# Altium footprint library PCB_Footprints.PcbLib: 303 footprints (part 12 of 19)
Each footprint in its own frame and in the unit in brackets; x right, y up, seen from the top. Pads: shape width x height; smd on the part's side, far side on the other; paste and mask are expansions set on the pad; w line width, h text height; cw(c..) or ccw(c..) is an arc to the next point about the centre after c.
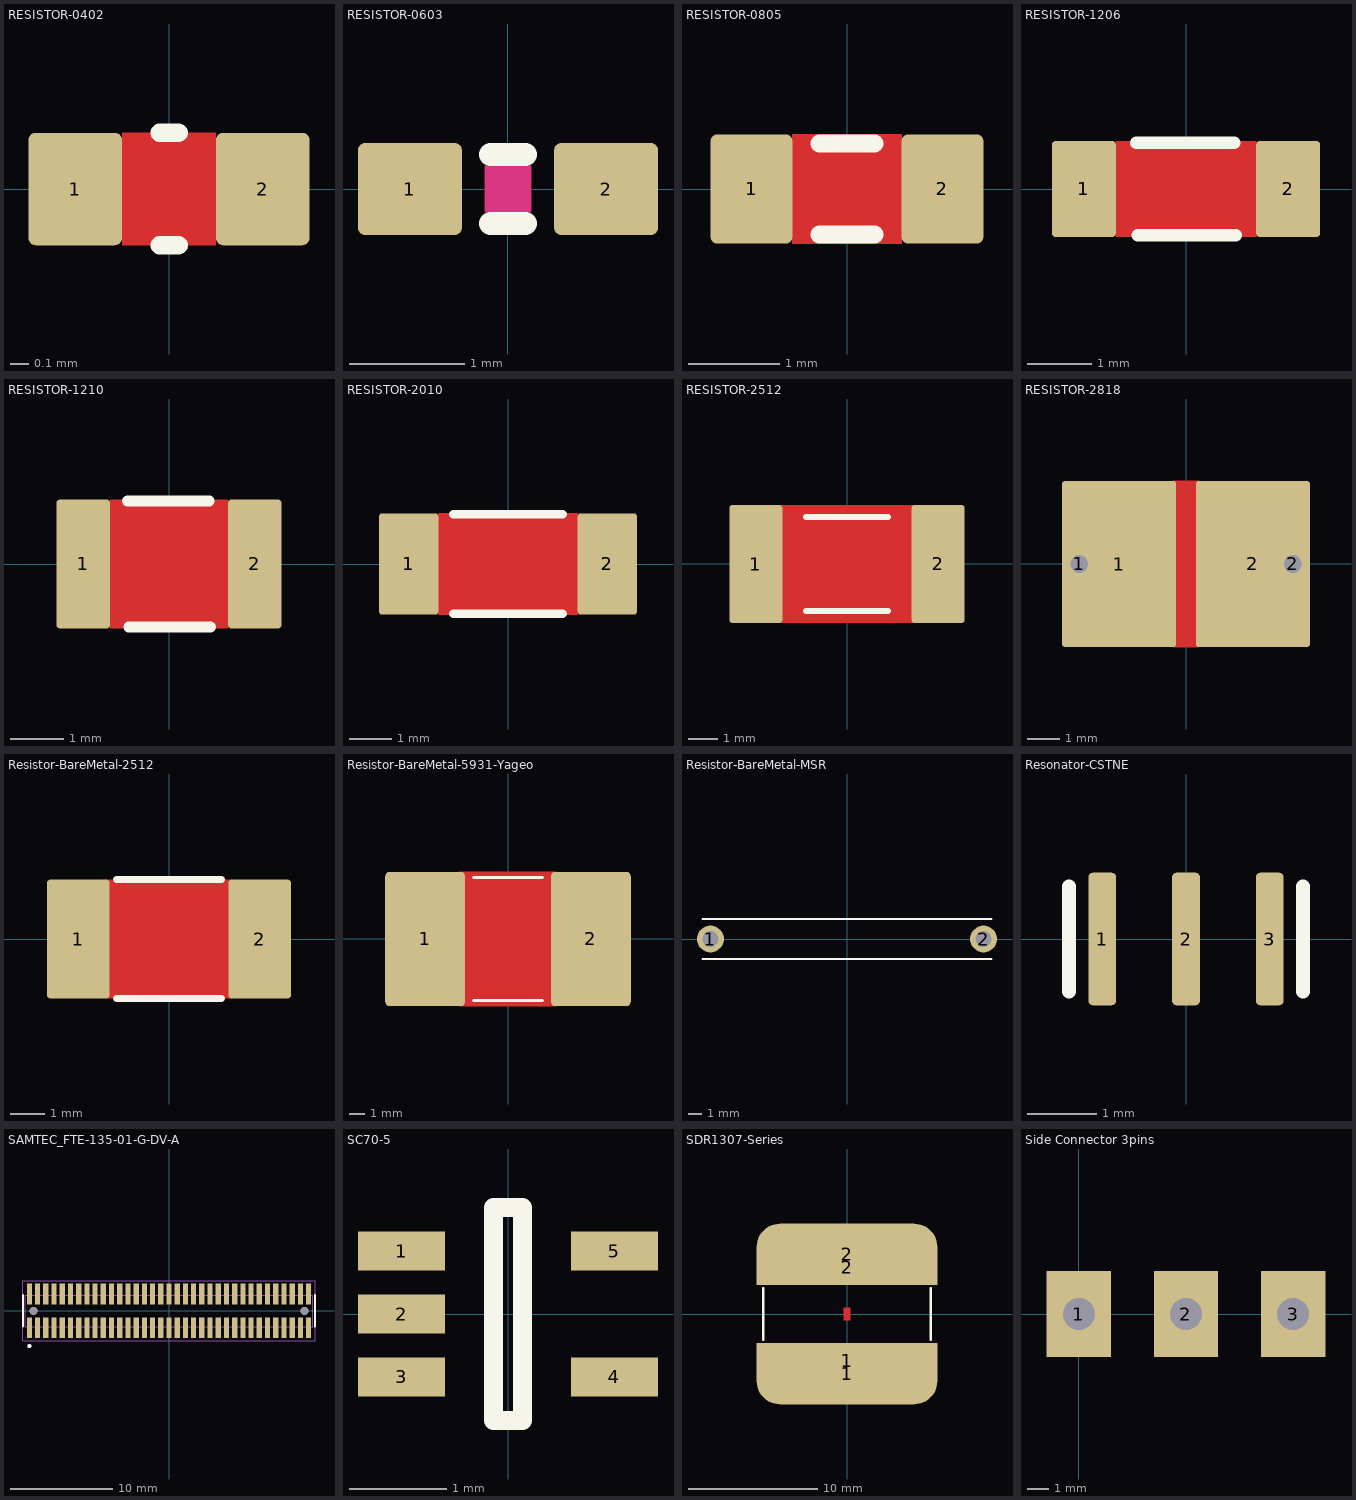
[diagram p11: the footprints below, top view; thin cyan lines are the x and y axes]

## RESISTOR-0402 [mm] "Metric 1005, EIA 0402 Drawn per Yageo \"Chip resistors Mounting\" rev 10"
height 1
pads (2):
  rrect15% 0.5x0.6 smd: 1(-0.5,0) 2(0.5,0)
Top Layer:
  pour cut-out: -0.25,0.3 0.25,0.3 0.25,-0.3 -0.25,-0.3
Top Overlay:
  lines w0.1: -0.05,-0.3 0.05,-0.3 ; -0.05,0.3 0.05,0.3
3D body "User Library-0402(1005M) Res.step": height 0.51, standoff 0, extent -0.508,-0.254 0.508,0.254

## RESISTOR-0603 [mm] "Metric 1608, EIA 0603 Drawn per Yageo \"Chip resistors Mounting\" rev 10"
height 1
pads (2):
  rrect15% 0.9x0.8 smd: 1(-0.85,0) 2(0.85,0)
Top Layer:
  pour cut-out: -0.2,0.2 0.2,0.2 0.2,-0.2 -0.2,-0.2
Top Layer keep-out:
  rectangle: -0.2,-0.2 0.2,0.2
Top Overlay:
  lines w0.2: -0.15,-0.3 0.15,-0.3 ; -0.15,0.3 0.15,0.3
3D body "RESC1608X55N EIA 0603.step": height 0.55, standoff 0, extent -0.8,-0.4 0.8,0.4

## RESISTOR-0805 [mm] "Metric 2012, EIA 0805. Drawn per Yageo \"Chip resistors Mounting\" rev 10"
height 1
pads (2):
  rrect15% 0.9x1.2 smd: 1(-1.05,0) 2(1.05,0)
Top Layer:
  pour cut-out: -0.6,0.6 0.6,0.6 0.6,-0.6 -0.6,-0.6
Top Overlay:
  lines w0.2: -0.3,-0.5 0.3,-0.5 ; -0.3,0.5 0.3,0.5
3D body "RESC2012X60N EIA 0805.step": height 0.6, standoff 0, extent -1,-0.6 1,0.6

## RESISTOR-1206 [mm] "Metric 3216, EIA 1206. Drawn per Yageo \"Chip resistors Mounting\" rev 10"
height 0.7
pads (2):
  rrect10% 1x1.5 smd: 1(-1.6,0) 2(1.6,0)
Top Layer:
  pour cut-out: -1.1,0.75 1.1,0.75 1.1,-0.75 -1.1,-0.75
Top Overlay:
  lines w0.2: -0.775,0.725 0.75,0.725 ; -0.75,-0.725 0.775,-0.725
3D body "User Library-RESC3216X06N.step": height 0.55, standoff 0, extent -1.6,-0.8 1.6,0.8

## RESISTOR-1210 [mm] "Metric 3225 EIA 1210. Drawn per Yageo \"Chip resistors Mounting\" rev 10"
height 0.7
pads (2):
  rrect10% 1x2.4 smd: 1(-1.6,0) 2(1.6,0)
Top Layer:
  pour cut-out: -1.1,1.2 1.1,1.2 1.1,-1.2 -1.1,-1.2
Top Overlay:
  lines w0.2: -0.775,1.175 0.75,1.175 ; -0.75,-1.175 0.775,-1.175
3D body "User Library-RESC3225X06N.step": height 0.54, standoff -0.01, extent -1.6,-1.25 1.6,1.25

## RESISTOR-2010 [mm] "Metric 5025 EIA 2010. Drawn per Yageo \"Chip resistors Mounting\" rev 10"
height 0.7
pads (2):
  rrect10% 1.4x2.4 smd: 1(-2.35,0) 2(2.35,0)
Top Layer:
  pour cut-out: -1.65,1.2 1.65,1.2 1.65,-1.2 -1.65,-1.2
Top Overlay:
  lines w0.2: -1.3,-1.175 1.3,-1.175 ; -1.3,1.175 1.3,1.175
3D body "User Library-R_2010.step": height 0.6, standoff 0, extent -2.5,-1.25 2.5,1.25

## RESISTOR-2512 [mm] "Metric 6432, EIA 2512 Drawn per Yageo \"Chip resistors Mounting\" rev 10"
height 1.2
pads (2):
  rrect10% 1.8x4 smd: 1(-3.1,0) 2(3.1,0)
Top Layer:
  pour cut-out: -2.3,2 2.3,2 2.3,-2 -2.3,-2
Top Overlay:
  lines w0.2: -1.4,-1.6 1.4,-1.6 ; -1.4,1.6 1.4,1.6
3D body "User Library-RESC6432X06.step": height 0.6, standoff 0, extent -3.2,-1.6 3.2,1.6

## RESISTOR-2818 [mm] "7.10mm x 4.60mm from WSHM2818 Datasheet"
height 1.75
pads (4):
  round 0.9 hole 0.54: 1(-3.275,0) 2(3.275,0)
  rrect5% 3.5x5.1 smd: 1(-2.055,0) 2(2.055,0)
Top Layer:
  pour cut-out: -0.4,2.55 0.4,2.55 0.375,-2.55 -0.375,-2.55
3D body "WSHM2818.stp": height 1.51, standoff 0.01, extent -3.549,-2.3 3.55,2.3

## Resistor-BareMetal-2512 [mm] "3.05mm x 6.35mm mm Metal resistor for Bourns CSS2H-2512"
height 1.65
pads (2):
  rrect10% 1.8x3.4 smd: 1(-2.6,0) 2(2.6,0)
Top Layer:
  pour cut-out: -1.825,1.7 1.8,1.7 1.8,-1.7 -1.8,-1.7
Top Overlay:
  lines w0.2: -1.5,-1.7 1.5,-1.7 ; -1.5,1.7 1.5,1.7
3D body "CSS2H-2512.stp": height 0.83, standoff 0, extent -3.175,-1.525 3.175,1.525

## Resistor-BareMetal-5931-Yageo [mm] "15.00mm x 7.75mm Metal resistor for Yageo PU serie"
height 2.09
pads (2):
  rrect10% 5.2x8.75 smd: 1(-5.4,0) 2(5.4,0)
Top Layer:
  pour cut-out: -3.175,4.375 3.15,4.375 3.15,-4.375 -3.175,-4.375
Top Overlay:
  lines w0.2: -2.25,-4 2.25,-4 ; -2.25,4 2.25,4
3D body "User Library-WSSL5931.step": height 2.36, standoff 0.01, extent -7.5,-3.875 7.5,3.875

## Resistor-BareMetal-MSR [mm] "Shunt Resistor"
height 25.4
pads (2):
  round 2 hole 1.2: 1(-10.15,0) 2(10.15,0)
Top Overlay:
  lines w0.15: -10.75,-1.5 10.75,-1.5 ; -10.75,1.5 10.75,1.5
3D body: height 25.4, standoff 24, extent -10.75,-1.5 10.75,1.5
3D body: height 25.4, standoff 0, extent 9.5,-1.5 10.75,1.5
3D body: height 25.4, standoff 0, extent -10.75,-1.5 -9.5,1.5

## Resonator-CSTNE [mm] "Murata CSTNE series resonator. Built from CSTNE20M0VH3C000R0 datasheet"
height 1
pads (3):
  rrect30% 0.4x1.9 smd: 1(-1.2,0) 2(0,0) 3(1.2,0)
Top Overlay:
  lines w0.2: -1.675,-0.75 -1.675,0.75 ; 1.675,-0.75 1.675,0.75
3D body: height 1, standoff 0, extent -1.5,-0.55 1.5,0.55
3D body: height 0.4, standoff 0, extent -1.675,-0.75 1.675,0.75

## SAMTEC_FTE-135-01-G-DV-A [mm]
pads (72):
  rect 0.508x2.03 smd: 01(-13.6,-1.65) 02(-13.6,1.65) 03(-12.8,-1.65) 04(-12.8,1.65) 05(-12,-1.65) 06(-12,1.65) 07(-11.2,-1.65) 08(-11.2,1.65) 09(-10.4,-1.65) 10(-10.4,1.65) 11(-9.6,-1.65) 12(-9.6,1.65) 13(-8.8,-1.65) 14(-8.8,1.65) 15(-8,-1.65) 16(-8,1.65) 17(-7.2,-1.65) 18(-7.2,1.65) 19(-6.4,-1.65) 20(-6.4,1.65) 21(-5.6,-1.65) 22(-5.6,1.65) 23(-4.8,-1.65) 24(-4.8,1.65) 25(-4,-1.65) 26(-4,1.65) 27(-3.2,-1.65) 28(-3.2,1.65) 29(-2.4,-1.65) 30(-2.4,1.65) 31(-1.6,-1.65) 32(-1.6,1.65) 33(-0.8,-1.65) 34(-0.8,1.65) 35(0,-1.65) 36(0,1.65) 37(0.8,-1.65) 38(0.8,1.65) 39(1.6,-1.65) 40(1.6,1.65) 41(2.4,-1.65) 42(2.4,1.65) 43(3.2,-1.65) 44(3.2,1.65) 45(4,-1.65) 46(4,1.65) 47(4.8,-1.65) 48(4.8,1.65) 49(5.6,-1.65) 50(5.6,1.65) 51(6.4,-1.65) 52(6.4,1.65) 53(7.2,-1.65) 54(7.2,1.65) 55(8,-1.65) 56(8,1.65) 57(8.8,-1.65) 58(8.8,1.65) 59(9.6,-1.65) 60(9.6,1.65) 61(10.4,-1.65) 62(10.4,1.65) 63(11.2,-1.65) 64(11.2,1.65) 65(12,-1.65) 66(12,1.65) 67(12.8,-1.65) 68(12.8,1.65) 69(13.6,-1.65) 70(13.6,1.65)
  round 0.76 hole 0.76 unplated: ""(-13.2,0) ""(13.2,0)
Top Overlay:
  circle w0.2: c-13.6,-3.425 r0.1
  lines w0.2: -14.204,-1.524 -14.204,1.524 ; 14.204,-1.524 14.204,1.524
Mechanical 13:
  circle w0.2: c-13.6,-3.425 r0.1
  lines w0.1: -14,-1.524 -14,1.524 14,1.524 14,-1.524 -14,-1.524
Mechanical 15:
  lines w0.05: -14.25,-2.915 -14.25,2.915 14.25,2.915 14.25,-2.915 -14.25,-2.915
3D body "FTE-135-01-G-DV-A.step": height 3.7, standoff -0.62, extent -14.002,-2.286 14.002,2.286

## SC70-5 [mm] "SOT353, SC70-5, From TI OPA314's DCK footprint"
height 1.1
pads (5):
  rect 0.9x0.4 smd: 1(-1.1,0.65) 2(-1.1,0) 3(-1.1,-0.65) 4(1.1,-0.65) 5(1.1,0.65)
Top Overlay:
  lines w0.2: -0.15,-1.1 0.15,-1.1 0.15,1.1 -0.15,1.1 -0.15,-1.1
3D body "User Library-sot353.STEP": height 1, standoff 0, extent -1.15,-1.05 1.15,1.05

## SDR1307-Series [mm] "Per BOURNS Product Specification for Inductors  SDR1307 Series"
height 7
pads (4):
  rrect75% 14x4.75 smd: 1(0,-4.625) 2(0,4.625)
  rect 14x2.75 smd: 1(0,-3.625) 2(0,3.625)
Top Layer:
  pour cut-out: -0.25,0.475 0.25,0.475 0.25,-0.475 -0.25,-0.475
Top Overlay:
  lines w0.2: -6.5,-2 -6.5,2 ; 6.5,-2 6.5,2
3D body "SDR1307.STP": height 7, standoff 0, extent -6.5,-6.5 6.5,6.5

## Side Connector 3pins [mm]
pads (3):
  rect 3x4 hole 1.5: 1(0,0) 2(5,0) 3(10,0)